# Altium footprint library Footprints.PcbLib: 67 footprints (part 5 of 5)
Each footprint in its own frame and in the unit in brackets; x right, y up, seen from the top. Pads: shape width x height; smd on the part's side, far side on the other; paste and mask are expansions set on the pad; w line width, h text height; cw(c..) or ccw(c..) is an arc to the next point about the centre after c.
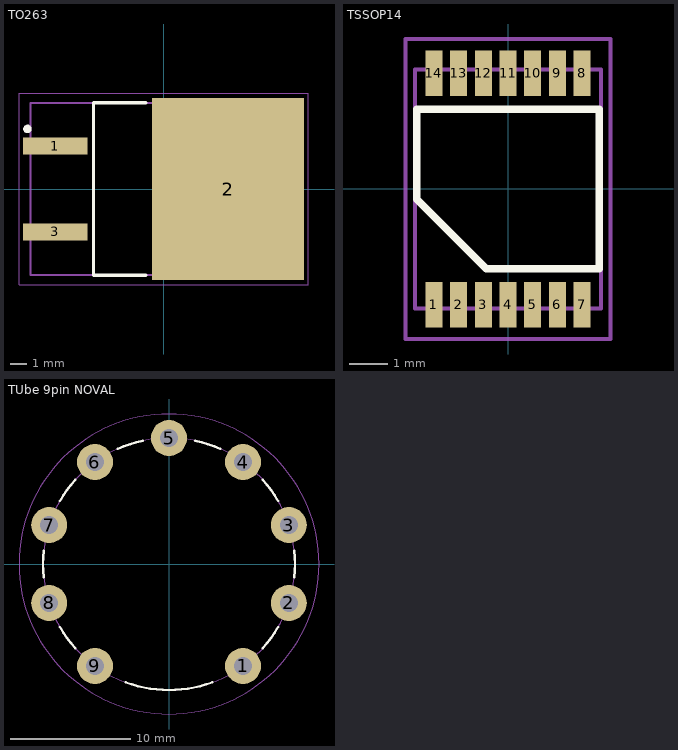
[diagram p4: the footprints below, top view; thin cyan lines are the x and y axes]

## TO263 [mm]
pads (3):
  rect 3.8x1 smd: 1(-6.4,2.54) 3(-6.4,-2.54)
  rect 9x10.75 smd: 2(3.8,0)
Top Overlay:
  circle w0.25: c-8.05,3.55 r0.125
  lines w0.2: -1.05,-5.1 -4.15,-5.1 -4.15,5.1 -1.05,5.1
Placement:
  lines w0.1: -7.874,-5.08 -7.874,5.08 5.94,5.08 6.494,5.08 7.62,3.833 7.62,-3.833 6.494,-5.08 5.94,-5.08 -7.874,-5.08
  text ".Designator" at -6,0 h1.2
Keep-Out:
  lines w0.05: -8.55,-5.65 -8.55,5.65 8.55,5.65 8.55,-5.65 -8.55,-5.65
3D body "User Library-DPAK.step": height 5.03, standoff 0.01, extent -7.892,-5.08 7.372,5.08

## TSSOP14 [mm]
pads (14):
  rect 0.45x1.2 smd: 1(-1.95,-3.05) 2(-1.3,-3.05) 3(-0.65,-3.05) 4(0,-3.05) 5(0.65,-3.05) 6(1.3,-3.05) 7(1.95,-3.05) 8(1.95,3.05) 9(1.3,3.05) 10(0.65,3.05) 11(0,3.05) 12(-0.65,3.05) 13(-1.3,3.05) 14(-1.95,3.05)
Top Overlay:
  lines w0.2: -2.4,-0.275 -0.575,-2.1 2.4,-2.1 2.4,2.1 -2.4,2.1 -2.4,-0.275
Placement:
  lines w0.1: -2.45,-3.15 -2.45,3.15 2.45,3.15 2.45,-3.15 -2.45,-3.15
Keep-Out:
  lines w0.1: -2.7,-3.95 -2.7,3.95 2.7,3.95 2.7,-3.95 -2.7,-3.95
3D body "User Library-TSSOP14-1.step": height 1.1, standoff 0, extent -2.5,-3.2 2.5,3.2

## TUbe 9pin NOVAL [mm]
pads (9):
  round 3 hole 1.5: 1(6.172,-8.495) 2(9.986,-3.245) 3(9.986,3.245) 4(6.172,8.495) 5(0,10.5) 6(-6.172,8.495) 7(-9.986,3.245) 8(-9.986,-3.245) 9(-6.172,-8.495)
Top Overlay:
  lines w0.2: -10.442,-1.098 cw(c0,0) -10.442,1.098 ; -9.093,-5.25 ccw(c0,0) -7.803,-7.026 ; -9.093,5.25 cw(c0,0) -7.803,7.026 ; -4.271,9.592 cw(c0,0) -2.183,10.271 ; -3.591,-9.867 ccw(c0,0) 0,-10.5 ccw(c0,0) 3.591,-9.867 ; 2.183,10.271 cw(c0,0) 4.271,9.592 ; 7.803,-7.026 ccw(c0,0) 9.093,-5.25 ; 7.803,7.026 cw(c0,0) 9.093,5.25 ; 10.442,-1.098 ccw(c0,0) 10.442,1.098
Placement:
  circle w0.1: c0,0 r10.5
  text ".Designator" at -6.625,-0.625 h3
Keep-Out:
  circle w0.05: c0,0 r12.5
3D body "final.STEP": height 62.4, standoff 5.54, extent -10.782,-10.722 10.783,10.818
3D body: height 7.5, standoff 4.5, extent -11,-10.997 11,10.997
3D body: height 10, standoff 0, extent -9,-8.997 9,8.997